# Altium footprint library JL_PCB.PCBLIB: 1112 footprints (part 71 of 71)
Each footprint in its own frame and in the unit in brackets; x right, y up, seen from the top. Pads: shape width x height; smd on the part's side, far side on the other; paste and mask are expansions set on the pad; w line width, h text height; cw(c..) or ccw(c..) is an arc to the next point about the centre after c.
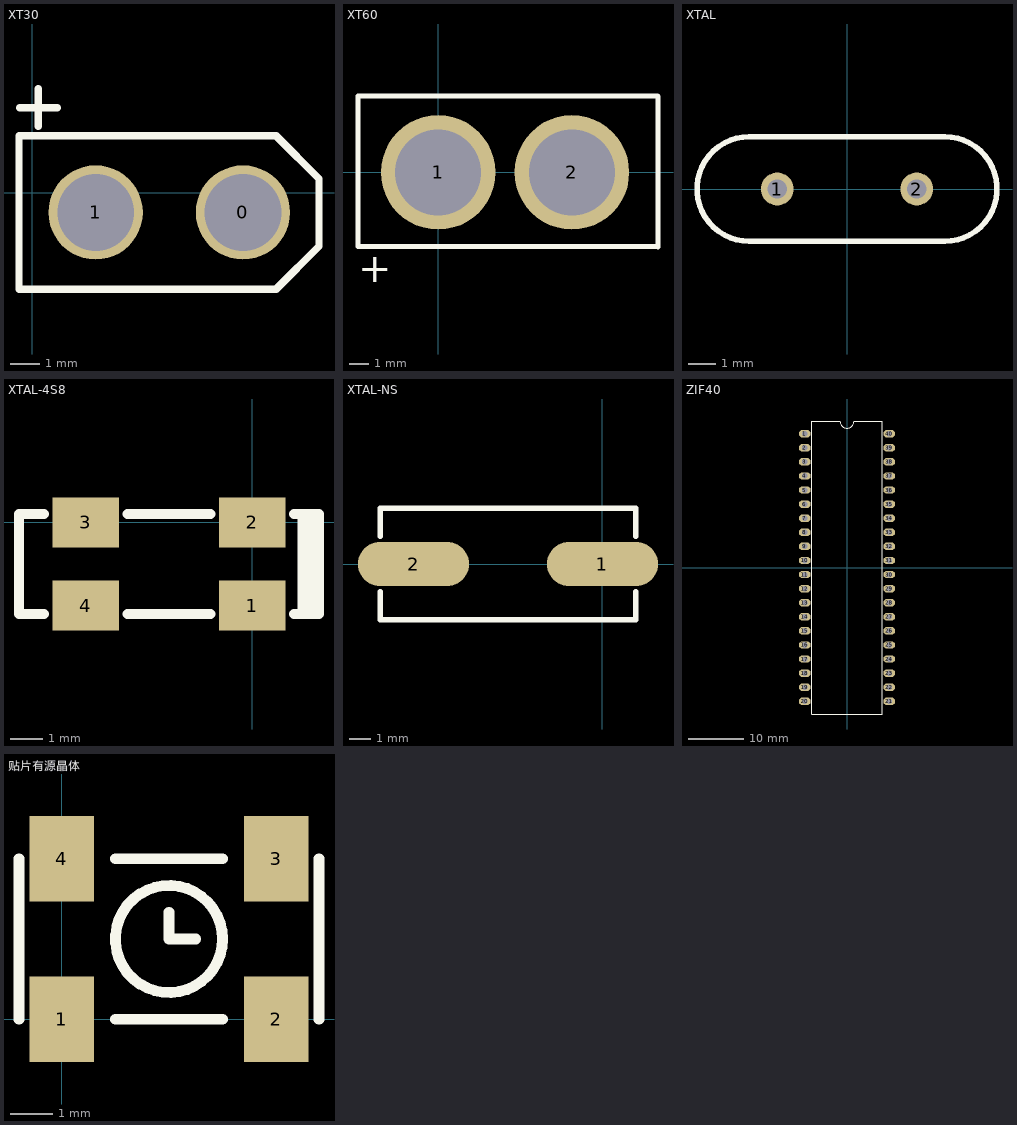
[diagram p70: the footprints below, top view; thin cyan lines are the x and y axes]

## XT30 [mm]
pads (2):
  round 3.2 hole 2.6: 0(7.147,-0.671) 1(2.147,-0.671)
TopOverlay:
  lines w0.254: -0.433,2.885 0.837,2.885 ; 0.202,2.25 0.202,3.52 ; 8.33,-3.211 9.727,-1.814 ; 8.33,1.869 9.727,0.472 ; 9.727,-1.814 8.27,-3.271 -0.453,-3.271 -0.453,1.929 8.27,1.929 9.727,0.472 ; 9.727,-1.814 9.727,0.472
3D body: height 11.5, standoff 5, extent 0.202,-2.576 9.092,1.234
3D body: height 5, standoff 0, extent -0.433,-3.211 9.727,1.996

## XT60 [mm]
pads (2):
  round 6 hole 4.5: 1(0,0) 2(7,0)
TopOverlay:
  lines w0.254: -4.2,-3.819 -4.2,4 7.8,4 8.776,4 11.488,4 11.506,3.982 11.506,-3.912 11.481,-3.886 7.809,-3.886 -4.191,-3.886 ; 11.5,-3.708 11.5,3.988
  text "+" at -4.191,-5.74 h1.52

## XTAL [mm] "Radial Cap, Thru-Hole; 2 Leads; 0.2 in Pin Spacing"
pads (2):
  round 1.2 hole 0.7: 1(-2.54,0) 2(2.54,0)
TopOverlay:
  lines w0.203: -3.556,-1.905 cw(c-3.556,0) -3.556,1.905 3.556,1.905 cw(c3.556,0) 3.556,-1.905 -3.556,-1.905
3D body "XTAL.STEP": height 3.22, standoff -2.41, extent -5.334,-2.054 5.334,2.054

## XTAL-4S8 [mil]
pads (4):
  rect 80x60 smd: 1(0,-100) 2(0,0) 3(-200,0) 4(-200,-100)
TopOverlay:
  lines w12: -250,-110 -280,-110 -280,10 -250,10 ; -150,-110 -50,-110 ; -150,10 -50,10 ; 50,-110 80,-110 80,10 50,10 ; 60,-110 60,10 ; 70,-110 70,10

## XTAL-NS [mil]
pads (2):
  oval 200x80 smd: 1(0,0) 2(-340,0)
TopOverlay:
  lines w10: -400,-50 -400,-100 60,-100 60,-50 ; -400,50 -400,100 60,100 60,50
3D body "User Library-HC49S-SMD.step": height 173.22, standoff 0, extent -433.77,-95.45 93.79,97.46

## ZIF40 [mil]
pads (40):
  oct 80x52 hole 39.37: 1(-300,950) 2(-300,850) 3(-300,750) 4(-300,650) 5(-300,550) 6(-300,450) 7(-300,350) 8(-300,250) 9(-300,150) 10(-300,50) 11(-300,-50) 12(-300,-150) 13(-300,-250) 14(-300,-350) 15(-300,-450) 16(-300,-550) 17(-300,-650) 18(-300,-750) 19(-300,-850) 20(-300,-950) 21(300,-950) 22(300,-850) 23(300,-750) 24(300,-650) 25(300,-550) 26(300,-450) 27(300,-350) 28(300,-250) 29(300,-150) 30(300,-50) 31(300,50) 32(300,150) 33(300,250) 34(300,350) 35(300,450) 36(300,550) 37(300,650) 38(300,750) 39(300,850) 40(300,950)
TopOverlay:
  lines w6: -250,-1040 -250,1040 -50,1040 ccw(c0,1040) 50,1040 250,1040 250,-1040 -250,-1040
3D body "ZIF-40.STEP": height 146.85, standoff -483.07, extent -487.3,-1195 452.3,1844.03

## 贴片有源晶体 [mil]
pads (4):
  rect 60x80 smd: 1(0,0) 2(200,0) 3(200,150) 4(0,150)
TopOverlay:
  circle w10: c100,75 r50
  lines w10: -40,0 -40,150 ; 50,0 150,0 ; 50,150 150,150 ; 100,100 100,75 125,75 ; 240,0 240,150
3D body "User Library-VX3-Quartz-Oscillator.STEP": height 73.62, standoff 10.63, extent -37.5,-23.43 238.09,173.43